# Altium schematic symbol library National Semiconductor Amplifier.SchLib: 1665 symbols (part 10 of 22) (continued)
## LMH6551MMX
designator U?
Differential, High Speed Op Amp, 8-pin Mini SOIC, 3500 Reel; PartNumber: LMH6551MMX; Manufacturer: National Semiconductor; PackageTopMarking: ZXTT*AU1A; PowerWise: Y; CompType: Amplifiers; DatasheetVersion: Feb-2005; PackageVersion: revF, Apr-2008; PackageReference: MUA08A; PackageDescription: MINI SOIC, .118 x .118 x .034in, 8 Lead, .0256in Pitch; RoHS: N; PinCount: 8; High-Reliability: Y; Code_JEDEC: MO-187-AA; ComponentLink1Description: Manufacturer URL; ComponentLink1URL: http://www.national.com/; ComponentLink2Description: LMH6551 Datasheet; ComponentLink2URL: http://www.national.com/ds/LM/LMH6551.pdf; ComponentLink3Description: LMH6551 Web Page; ComponentLink3URL: http://www.national.com/pf/LM/LMH6551.html; ComponentLink4Description: MUA08A Package Page; ComponentLink4URL: http://www.national.com/packaging/folders/mua08a.html
footprint MUA08A_N (TSOP, 8-Leads, Body 3x3mm, Pitch 0.65mm, IPC Medium Density)
footprint MUA08A_L (TSOP, 8-Leads, Body 3x3mm, Pitch 0.65mm, IPC High Density)
footprint MUA08A_M (TSOP, 8-Leads, Body 3x3mm, Pitch 0.65mm, IPC Low Density)
pins: 1 IN- (in), 2 VCM, 3 V+ (power), 4 OUT+ (out), 5 OUT- (out), 6 V- (power), 7 NC, 8 IN+ (in)

## LMH6551QMM/NOPB
designator U?
Differential, High Speed Op Amp, 8-pin Mini SOIC, Pb-Free, 1000 Reel; PartNumber: LMH6551QMM/NOPB; Manufacturer: National Semiconductor; PackageTopMarking: ZXTT*AU1Q; PowerWise: N; CompType: Amplifiers; High-Reliability: Y; DatasheetVersion: May-2011; PackageVersion: revF, Apr-2008; PackageReference: MUA08A; PackageDescription: MINI SOIC, .118 x .118 x .034in, 8 Lead, .0256in Pitch; RoHS: Y; PinCount: 8; Code_JEDEC: MO-187-AA; ComponentLink1Description: Manufacturer URL; ComponentLink1URL: http://www.national.com/; ComponentLink2Description: LMH6551 Datasheet; ComponentLink2URL: http://www.national.com/ds/LM/LMH6551.pdf; ComponentLink3Description: LMH6551 Web Page; ComponentLink3URL: http://www.national.com/pf/LM/LMH6551.html; ComponentLink4Description: MUA08A Package Page; ComponentLink4URL: http://www.national.com/packaging/folders/mua08a.html
footprint MUA08A_N (TSOP, 8-Leads, Body 3x3mm, Pitch 0.65mm, IPC Medium Density)
footprint MUA08A_L (TSOP, 8-Leads, Body 3x3mm, Pitch 0.65mm, IPC High Density)
footprint MUA08A_M (TSOP, 8-Leads, Body 3x3mm, Pitch 0.65mm, IPC Low Density)
pins: 1 IN- (in), 2 VCM, 3 V+ (power), 4 OUT+ (out), 5 OUT- (out), 6 V- (power), 7 NC, 8 IN+ (in)

## LMH6551QMME/NOPB
designator U?
Differential, High Speed Op Amp, 8-pin Mini SOIC, Pb-Free, 250 Reel; PartNumber: LMH6551QMME/NOPB; Manufacturer: National Semiconductor; PackageTopMarking: ZXTT*AU1Q; PowerWise: N; CompType: Amplifiers; High-Reliability: Y; DatasheetVersion: May-2011; PackageVersion: revF, Apr-2008; PackageReference: MUA08A; PackageDescription: MINI SOIC, .118 x .118 x .034in, 8 Lead, .0256in Pitch; RoHS: Y; PinCount: 8; Code_JEDEC: MO-187-AA; ComponentLink1Description: Manufacturer URL; ComponentLink1URL: http://www.national.com/; ComponentLink2Description: LMH6551 Datasheet; ComponentLink2URL: http://www.national.com/ds/LM/LMH6551.pdf; ComponentLink3Description: LMH6551 Web Page; ComponentLink3URL: http://www.national.com/pf/LM/LMH6551.html; ComponentLink4Description: MUA08A Package Page; ComponentLink4URL: http://www.national.com/packaging/folders/mua08a.html
footprint MUA08A_N (TSOP, 8-Leads, Body 3x3mm, Pitch 0.65mm, IPC Medium Density)
footprint MUA08A_L (TSOP, 8-Leads, Body 3x3mm, Pitch 0.65mm, IPC High Density)
footprint MUA08A_M (TSOP, 8-Leads, Body 3x3mm, Pitch 0.65mm, IPC Low Density)
pins: 1 IN- (in), 2 VCM, 3 V+ (power), 4 OUT+ (out), 5 OUT- (out), 6 V- (power), 7 NC, 8 IN+ (in)

## LMH6551QMMX/NOPB
designator U?
Differential, High Speed Op Amp, 8-pin Mini SOIC, Pb-Free, 3500 Reel; PartNumber: LMH6551QMMX/NOPB; Manufacturer: National Semiconductor; PackageTopMarking: ZXTT*AU1Q; PowerWise: N; CompType: Amplifiers; High-Reliability: Y; DatasheetVersion: May-2011; PackageVersion: revF, Apr-2008; PackageReference: MUA08A; PackageDescription: MINI SOIC, .118 x .118 x .034in, 8 Lead, .0256in Pitch; RoHS: Y; PinCount: 8; Code_JEDEC: MO-187-AA; ComponentLink1Description: Manufacturer URL; ComponentLink1URL: http://www.national.com/; ComponentLink2Description: LMH6551 Datasheet; ComponentLink2URL: http://www.national.com/ds/LM/LMH6551.pdf; ComponentLink3Description: LMH6551 Web Page; ComponentLink3URL: http://www.national.com/pf/LM/LMH6551.html; ComponentLink4Description: MUA08A Package Page; ComponentLink4URL: http://www.national.com/packaging/folders/mua08a.html
footprint MUA08A_N (TSOP, 8-Leads, Body 3x3mm, Pitch 0.65mm, IPC Medium Density)
footprint MUA08A_L (TSOP, 8-Leads, Body 3x3mm, Pitch 0.65mm, IPC High Density)
footprint MUA08A_M (TSOP, 8-Leads, Body 3x3mm, Pitch 0.65mm, IPC Low Density)
pins: 1 IN- (in), 2 VCM, 3 V+ (power), 4 OUT+ (out), 5 OUT- (out), 6 V- (power), 7 NC, 8 IN+ (in)

## LMH6552MA
designator U?
1.5 GHz Fully Differential Amplifier, 8-pin Narrow SOIC; PartNumber: LMH6552MA; Manufacturer: National Semiconductor; PackageTopMarking: NSZXTT*LMH65*52MA; PowerWise: Y; CompType: Amplifiers; DatasheetVersion: Sep-2007; PackageVersion: revM, May-2009; PackageReference: M08A; PackageDescription: SOIC Narrow, 4.9 x 3.9 x 1.45mm, 8 Lead, 1.27mm Pitch; RoHS: Y; PinCount: 8; High-Reliability: Y; Code_JEDEC: MS-012-AA; Code_IPC: SOIC127P600-8; ComponentLink1Description: Manufacturer URL; ComponentLink1URL: http://www.national.com/; ComponentLink2Description: LMH6552 Datasheet; ComponentLink2URL: http://www.national.com/ds/LM/LMH6552.pdf; ComponentLink3Description: LMH6552 Web Page; ComponentLink3URL: http://www.national.com/pf/LM/LMH6552.html; ComponentLink4Description: M08A Package Page; ComponentLink4URL: http://www.national.com/packaging/folders/m08a.html
footprint M08A_N (SOIC, 8-Leads, Body 4.9x3.9mm, Pitch 1.27mm, IPC Medium Density)
footprint M08A_L (SOIC, 8-Leads, Body 4.9x3.9mm, Pitch 1.27mm, IPC High Density)
footprint M08A_M (SOIC, 8-Leads, Body 4.9x3.9mm, Pitch 1.27mm, IPC Low Density)
pins: 1 IN- (in), 2 VCM, 3 V+ (power), 4 OUT+ (out), 5 OUT- (out), 6 V- (power), 7 EN, 8 IN+ (in)

## LMH6552MA/NOPB
designator U?
1.5 GHz Fully Differential Amplifier, 8-pin Narrow SOIC, Pb-Free; PartNumber: LMH6552MA/NOPB; Manufacturer: National Semiconductor; PackageTopMarking: NSZXTT*LMH65*52MA; PowerWise: Y; CompType: Amplifiers; DatasheetVersion: Sep-2007; PackageVersion: revM, May-2009; PackageReference: M08A; PackageDescription: SOIC Narrow, 4.9 x 3.9 x 1.45mm, 8 Lead, 1.27mm Pitch; RoHS: Y; PinCount: 8; High-Reliability: Y; Code_JEDEC: MS-012-AA; Code_IPC: SOIC127P600-8; ComponentLink1Description: Manufacturer URL; ComponentLink1URL: http://www.national.com/; ComponentLink2Description: LMH6552 Datasheet; ComponentLink2URL: http://www.national.com/ds/LM/LMH6552.pdf; ComponentLink3Description: LMH6552 Web Page; ComponentLink3URL: http://www.national.com/pf/LM/LMH6552.html; ComponentLink4Description: M08A Package Page; ComponentLink4URL: http://www.national.com/packaging/folders/m08a.html
footprint M08A_N (SOIC, 8-Leads, Body 4.9x3.9mm, Pitch 1.27mm, IPC Medium Density)
footprint M08A_L (SOIC, 8-Leads, Body 4.9x3.9mm, Pitch 1.27mm, IPC High Density)
footprint M08A_M (SOIC, 8-Leads, Body 4.9x3.9mm, Pitch 1.27mm, IPC Low Density)
pins: 1 IN- (in), 2 VCM, 3 V+ (power), 4 OUT+ (out), 5 OUT- (out), 6 V- (power), 7 EN, 8 IN+ (in)

## LMH6552MAX/NOPB
designator U?
1.5 GHz Fully Differential Amplifier, 8-pin Narrow SOIC, Pb-Free; PartNumber: LMH6552MAX/NOPB; Manufacturer: National Semiconductor; PackageTopMarking: NSZXTT*LMH65*52MA; PowerWise: Y; CompType: Amplifiers; DatasheetVersion: Sep-2007; PackageVersion: revM, May-2009; PackageReference: M08A; PackageDescription: SOIC Narrow, 4.9 x 3.9 x 1.45mm, 8 Lead, 1.27mm Pitch; RoHS: Y; PinCount: 8; High-Reliability: Y; Code_JEDEC: MS-012-AA; Code_IPC: SOIC127P600-8; ComponentLink1Description: Manufacturer URL; ComponentLink1URL: http://www.national.com/; ComponentLink2Description: LMH6552 Datasheet; ComponentLink2URL: http://www.national.com/ds/LM/LMH6552.pdf; ComponentLink3Description: LMH6552 Web Page; ComponentLink3URL: http://www.national.com/pf/LM/LMH6552.html; ComponentLink4Description: M08A Package Page; ComponentLink4URL: http://www.national.com/packaging/folders/m08a.html
footprint M08A_N (SOIC, 8-Leads, Body 4.9x3.9mm, Pitch 1.27mm, IPC Medium Density)
footprint M08A_L (SOIC, 8-Leads, Body 4.9x3.9mm, Pitch 1.27mm, IPC High Density)
footprint M08A_M (SOIC, 8-Leads, Body 4.9x3.9mm, Pitch 1.27mm, IPC Low Density)
pins: 1 IN- (in), 2 VCM, 3 V+ (power), 4 OUT+ (out), 5 OUT- (out), 6 V- (power), 7 EN, 8 IN+ (in)

## LMH6552SD
designator U?
1.5 GHz Fully Differential Amplifier, 8-pin LLP; PartNumber: LMH6552SD; Manufacturer: National Semiconductor; PackageTopMarking: XYTT*6552; PowerWise: Y; CompType: Amplifiers; DatasheetVersion: Sep-2007; PackageVersion: revA, Jan-2004; PackageReference: SDA08C; PackageDescription: LLP, Plastic, Dual, 2.5 x 3.0 x 0.8mm Body, 8 Lead, 0.5mm Pitch, No Pullback; RoHS: Y; PinCount: 8; High-Reliability: Y; ComponentLink1Description: Manufacturer URL; ComponentLink1URL: http://www.national.com/; ComponentLink2Description: LMH6552 Datasheet; ComponentLink2URL: http://www.national.com/ds/LM/LMH6552.pdf; ComponentLink3Description: LMH6552 Web Page; ComponentLink3URL: http://www.national.com/pf/LM/LMH6552.html; ComponentLink4Description: SDA08C Package Page; ComponentLink4URL: http://www.national.com/packaging/folders/sda08c.html
footprint SDA08C (SON, 8-Leads, Body 2.5x3mm, Pitch 0.5mm, NSC Recommended)
part A pins: 1 IN- (in), 2 VCM, 3 V+ (power), 4 OUT+ (out), 5 OUT- (out), 6 V- (power), 7 EN, 8 IN+ (in)
part B pins: 9 DAP

## LMH6552SD/NOPB
designator U?
1.5 GHz Fully Differential Amplifier, 8-pin LLP, Pb-Free; PartNumber: LMH6552SD/NOPB; Manufacturer: National Semiconductor; PackageTopMarking: XYTT*6552; PowerWise: Y; CompType: Amplifiers; DatasheetVersion: Sep-2007; PackageVersion: revA, Jan-2004; PackageReference: SDA08C; PackageDescription: LLP, Plastic, Dual, 2.5 x 3.0 x 0.8mm Body, 8 Lead, 0.5mm Pitch, No Pullback; RoHS: Y; PinCount: 8; High-Reliability: Y; ComponentLink1Description: Manufacturer URL; ComponentLink1URL: http://www.national.com/; ComponentLink2Description: LMH6552 Datasheet; ComponentLink2URL: http://www.national.com/ds/LM/LMH6552.pdf; ComponentLink3Description: LMH6552 Web Page; ComponentLink3URL: http://www.national.com/pf/LM/LMH6552.html; ComponentLink4Description: SDA08C Package Page; ComponentLink4URL: http://www.national.com/packaging/folders/sda08c.html
footprint SDA08C (SON, 8-Leads, Body 2.5x3mm, Pitch 0.5mm, NSC Recommended)
part A pins: 1 IN- (in), 2 VCM, 3 V+ (power), 4 OUT+ (out), 5 OUT- (out), 6 V- (power), 7 EN, 8 IN+ (in)
part B pins: 9 DAP

## LMH6552SDX/NOPB
designator U?
1.5 GHz Fully Differential Amplifier, 8-pin LLP, Pb-Free; PartNumber: LMH6552SDX/NOPB; Manufacturer: National Semiconductor; PackageTopMarking: XYTT*6552; PowerWise: Y; CompType: Amplifiers; DatasheetVersion: Sep-2007; PackageVersion: revA, Jan-2004; PackageReference: SDA08C; PackageDescription: LLP, Plastic, Dual, 2.5 x 3.0 x 0.8mm Body, 8 Lead, 0.5mm Pitch, No Pullback; RoHS: Y; PinCount: 8; High-Reliability: Y; ComponentLink1Description: Manufacturer URL; ComponentLink1URL: http://www.national.com/; ComponentLink2Description: LMH6552 Datasheet; ComponentLink2URL: http://www.national.com/ds/LM/LMH6552.pdf; ComponentLink3Description: LMH6552 Web Page; ComponentLink3URL: http://www.national.com/pf/LM/LMH6552.html; ComponentLink4Description: SDA08C Package Page; ComponentLink4URL: http://www.national.com/packaging/folders/sda08c.html
footprint SDA08C (SON, 8-Leads, Body 2.5x3mm, Pitch 0.5mm, NSC Recommended)
part A pins: 1 IN- (in), 2 VCM, 3 V+ (power), 4 OUT+ (out), 5 OUT- (out), 6 V- (power), 7 EN, 8 IN+ (in)
part B pins: 9 DAP

## LMH6553MR
designator U?
900 MHz Fully Differential Amplifier with Output Limiting Clamp, 9-pin PSOP; PartNumber: LMH6553; Manufacturer: National Semiconductor; PackageTopMarking: NSXYTT*LMH65*53MR; PowerWise: Y; CompType: Amplifiers; DatasheetVersion: Nov-2008; PackageVersion: revB, Dec-2007; PackageReference: MRA08B; PackageDescription: Molded, PSOP .193 x .154 x .058in, 8 Lead, .050in Pitch, Large DAP; RoHS: Y; PinCount: 8; High-Reliability: Y; Code_JEDEC: MS-012-AA; ComponentLink1Description: Manufacturer URL; ComponentLink1URL: http://www.national.com/; ComponentLink2Description: LMH6553 Datasheet; ComponentLink2URL: http://www.national.com/ds/LM/LMH6553.pdf; ComponentLink3Description: LMH6553 Web Page; ComponentLink3URL: http://www.national.com/pf/LM/LMH6553.html; ComponentLink4Description: MRA08B Package Page; ComponentLink4URL: http://www.national.com/packaging/folders/mra08b.html
footprint MRA08B_N (SOIC, 8-Leads, Body 4.9x3.9mm, Pitch 1.27mm, Thermal Pad, IPC Medium Density)
footprint MRA08B_L (SOIC, 8-Leads, Body 4.9x3.9mm, Pitch 1.27mm, Thermal Pad, IPC High Density)
footprint MRA08B_M (SOIC, 8-Leads, Body 4.9x3.9mm, Pitch 1.27mm, Thermal Pad, IPC Low Density)
part A pins: 1 IN- (in), 2 VCM, 3 V+ (power), 4 OUT+ (out), 5 OUT- (out), 6 V- (power), 7 VCLAMP, 8 IN+ (in)
part B pins: 9 DAP

## LMH6553MR/NOPB
designator U?
900 MHz Fully Differential Amplifier with Output Limiting Clamp, 8-pin PSOP, Pb-Free; PartNumber: LMH6553MR/NOPB; Manufacturer: National Semiconductor; PackageTopMarking: NSXYTT*LMH65*53MR; PowerWise: Y; CompType: Amplifiers; DatasheetVersion: Nov-2008; PackageVersion: revB, Dec-2007; PackageReference: MRA08B; PackageDescription: Molded, PSOP .193 x .154 x .058in, 8 Lead, .050in Pitch, Large DAP; RoHS: Y; PinCount: 8; High-Reliability: Y; Code_JEDEC: MS-012-AA; ComponentLink1Description: Manufacturer URL; ComponentLink1URL: http://www.national.com/; ComponentLink2Description: LMH6553 Datasheet; ComponentLink2URL: http://www.national.com/ds/LM/LMH6553.pdf; ComponentLink3Description: LMH6553 Web Page; ComponentLink3URL: http://www.national.com/pf/LM/LMH6553.html; ComponentLink4Description: MRA08B Package Page; ComponentLink4URL: http://www.national.com/packaging/folders/mra08b.html
footprint MRA08B_N (SOIC, 8-Leads, Body 4.9x3.9mm, Pitch 1.27mm, Thermal Pad, IPC Medium Density)
footprint MRA08B_L (SOIC, 8-Leads, Body 4.9x3.9mm, Pitch 1.27mm, Thermal Pad, IPC High Density)
footprint MRA08B_M (SOIC, 8-Leads, Body 4.9x3.9mm, Pitch 1.27mm, Thermal Pad, IPC Low Density)
part A pins: 1 IN- (in), 2 VCM, 3 V+ (power), 4 OUT+ (out), 5 OUT- (out), 6 V- (power), 7 VCLAMP, 8 IN+ (in)
part B pins: 9 DAP

## LMH6553MRE/NOPB
designator U?
900 MHz Fully Differential Amplifier with Output Limiting Clamp, 8-pin PSOP, Pb-Free; PartNumber: LMH6553MRE/NOPB; Manufacturer: National Semiconductor; PackageTopMarking: NSXYTT*LMH65*53MR; PowerWise: Y; CompType: Amplifiers; DatasheetVersion: Nov-2008; PackageVersion: revB, Dec-2007; PackageReference: MRA08B; PackageDescription: Molded, PSOP .193 x .154 x .058in, 8 Lead, .050in Pitch, Large DAP; RoHS: Y; PinCount: 8; High-Reliability: Y; Code_JEDEC: MS-012-AA; ComponentLink1Description: Manufacturer URL; ComponentLink1URL: http://www.national.com/; ComponentLink2Description: LMH6553 Datasheet; ComponentLink2URL: http://www.national.com/ds/LM/LMH6553.pdf; ComponentLink3Description: LMH6553 Web Page; ComponentLink3URL: http://www.national.com/pf/LM/LMH6553.html; ComponentLink4Description: MRA08B Package Page; ComponentLink4URL: http://www.national.com/packaging/folders/mra08b.html
footprint MRA08B_N (SOIC, 8-Leads, Body 4.9x3.9mm, Pitch 1.27mm, Thermal Pad, IPC Medium Density)
footprint MRA08B_L (SOIC, 8-Leads, Body 4.9x3.9mm, Pitch 1.27mm, Thermal Pad, IPC High Density)
footprint MRA08B_M (SOIC, 8-Leads, Body 4.9x3.9mm, Pitch 1.27mm, Thermal Pad, IPC Low Density)
part A pins: 1 IN- (in), 2 VCM, 3 V+ (power), 4 OUT+ (out), 5 OUT- (out), 6 V- (power), 7 VCLAMP, 8 IN+ (in)
part B pins: 9 DAP

## LMH6553MRX/NOPB
designator U?
900 MHz Fully Differential Amplifier with Output Limiting Clamp, 8-pin PSOP, Pb-Free; PartNumber: LMH6553MRX/NOPB; Manufacturer: National Semiconductor; PackageTopMarking: NSXYTT*LMH65*53MR; PowerWise: Y; CompType: Amplifiers; DatasheetVersion: Nov-2008; PackageVersion: revB, Dec-2007; PackageReference: MRA08B; PackageDescription: Molded, PSOP .193 x .154 x .058in, 8 Lead, .050in Pitch, Large DAP; RoHS: Y; PinCount: 8; High-Reliability: Y; Code_JEDEC: MS-012-AA; ComponentLink1Description: Manufacturer URL; ComponentLink1URL: http://www.national.com/; ComponentLink2Description: LMH6553 Datasheet; ComponentLink2URL: http://www.national.com/ds/LM/LMH6553.pdf; ComponentLink3Description: LMH6553 Web Page; ComponentLink3URL: http://www.national.com/pf/LM/LMH6553.html; ComponentLink4Description: MRA08B Package Page; ComponentLink4URL: http://www.national.com/packaging/folders/mra08b.html
footprint MRA08B_N (SOIC, 8-Leads, Body 4.9x3.9mm, Pitch 1.27mm, Thermal Pad, IPC Medium Density)
footprint MRA08B_L (SOIC, 8-Leads, Body 4.9x3.9mm, Pitch 1.27mm, Thermal Pad, IPC High Density)
footprint MRA08B_M (SOIC, 8-Leads, Body 4.9x3.9mm, Pitch 1.27mm, Thermal Pad, IPC Low Density)
part A pins: 1 IN- (in), 2 VCM, 3 V+ (power), 4 OUT+ (out), 5 OUT- (out), 6 V- (power), 7 VCLAMP, 8 IN+ (in)
part B pins: 9 DAP

## LMH6553SD
designator U?
900 MHz Fully Differential Amplifier with Output Limiting Clamp, 8-pin LLP; PartNumber: LMH6553; Manufacturer: National Semiconductor; PackageTopMarking: XYTT*6553; PowerWise: Y; CompType: Amplifiers; DatasheetVersion: Nov-2008; PackageVersion: revA, Jan-2004; PackageReference: SDA08C; PackageDescription: LLP, Plastic, Dual, 2.5 x 3.0 x 0.8mm Body, 8 Lead, 0.5mm Pitch, No Pullback; RoHS: Y; PinCount: 8; High-Reliability: Y; ComponentLink1Description: Manufacturer URL; ComponentLink1URL: http://www.national.com/; ComponentLink2Description: LMH6553 Datasheet; ComponentLink2URL: http://www.national.com/ds/LM/LMH6553.pdf; ComponentLink3Description: LMH6553 Web Page; ComponentLink3URL: http://www.national.com/pf/LM/LMH6553.html; ComponentLink4Description: SDA08C Package Page; ComponentLink4URL: http://www.national.com/packaging/folders/sda08c.html
footprint SDA08C (SON, 8-Leads, Body 2.5x3mm, Pitch 0.5mm, NSC Recommended)
part A pins: 1 IN- (in), 2 VCM, 3 V+ (power), 4 OUT+ (out), 5 OUT- (out), 6 V- (power), 7 VCLAMP, 8 IN+ (in)
part B pins: 9 DAP

## LMH6553SD/NOPB
designator U?
900 MHz Fully Differential Amplifier with Output Limiting Clamp, 8-pin LLP, Pb-Free; PartNumber: LMH6553SD/NOPB; Manufacturer: National Semiconductor; PackageTopMarking: XYTT*6553; PowerWise: Y; CompType: Amplifiers; DatasheetVersion: Nov-2008; PackageVersion: revA, Jan-2004; PackageReference: SDA08C; PackageDescription: LLP, Plastic, Dual, 2.5 x 3.0 x 0.8mm Body, 8 Lead, 0.5mm Pitch, No Pullback; RoHS: Y; PinCount: 8; High-Reliability: Y; ComponentLink1Description: Manufacturer URL; ComponentLink1URL: http://www.national.com/; ComponentLink2Description: LMH6553 Datasheet; ComponentLink2URL: http://www.national.com/ds/LM/LMH6553.pdf; ComponentLink3Description: LMH6553 Web Page; ComponentLink3URL: http://www.national.com/pf/LM/LMH6553.html; ComponentLink4Description: SDA08C Package Page; ComponentLink4URL: http://www.national.com/packaging/folders/sda08c.html
footprint SDA08C (SON, 8-Leads, Body 2.5x3mm, Pitch 0.5mm, NSC Recommended)
part A pins: 1 IN- (in), 2 VCM, 3 V+ (power), 4 OUT+ (out), 5 OUT- (out), 6 V- (power), 7 VCLAMP, 8 IN+ (in)
part B pins: 9 DAP

## LMH6553SDE/NOPB
designator U?
900 MHz Fully Differential Amplifier with Output Limiting Clamp, 8-pin LLP, Pb-Free; PartNumber: LMH6553SDE/NOPB; Manufacturer: National Semiconductor; PackageTopMarking: XYTT*6553; PowerWise: Y; CompType: Amplifiers; DatasheetVersion: Nov-2008; PackageVersion: revA, Jan-2004; PackageReference: SDA08C; PackageDescription: LLP, Plastic, Dual, 2.5 x 3.0 x 0.8mm Body, 8 Lead, 0.5mm Pitch, No Pullback; RoHS: Y; PinCount: 8; High-Reliability: Y; ComponentLink1Description: Manufacturer URL; ComponentLink1URL: http://www.national.com/; ComponentLink2Description: LMH6553 Datasheet; ComponentLink2URL: http://www.national.com/ds/LM/LMH6553.pdf; ComponentLink3Description: LMH6553 Web Page; ComponentLink3URL: http://www.national.com/pf/LM/LMH6553.html; ComponentLink4Description: SDA08C Package Page; ComponentLink4URL: http://www.national.com/packaging/folders/sda08c.html
footprint SDA08C (SON, 8-Leads, Body 2.5x3mm, Pitch 0.5mm, NSC Recommended)
part A pins: 1 IN- (in), 2 VCM, 3 V+ (power), 4 OUT+ (out), 5 OUT- (out), 6 V- (power), 7 VCLAMP, 8 IN+ (in)
part B pins: 9 DAP

## LMH6553SDX/NOPB
designator U?
900 MHz Fully Differential Amplifier with Output Limiting Clamp, 8-pin LLP, Pb-Free; PartNumber: LMH6553SDX/NOPB; Manufacturer: National Semiconductor; PackageTopMarking: XYTT*6553; PowerWise: Y; CompType: Amplifiers; DatasheetVersion: Nov-2008; PackageVersion: revA, Jan-2004; PackageReference: SDA08C; PackageDescription: LLP, Plastic, Dual, 2.5 x 3.0 x 0.8mm Body, 8 Lead, 0.5mm Pitch, No Pullback; RoHS: Y; PinCount: 8; High-Reliability: Y; ComponentLink1Description: Manufacturer URL; ComponentLink1URL: http://www.national.com/; ComponentLink2Description: LMH6553 Datasheet; ComponentLink2URL: http://www.national.com/ds/LM/LMH6553.pdf; ComponentLink3Description: LMH6553 Web Page; ComponentLink3URL: http://www.national.com/pf/LM/LMH6553.html; ComponentLink4Description: SDA08C Package Page; ComponentLink4URL: http://www.national.com/packaging/folders/sda08c.html
footprint SDA08C (SON, 8-Leads, Body 2.5x3mm, Pitch 0.5mm, NSC Recommended)
part A pins: 1 IN- (in), 2 VCM, 3 V+ (power), 4 OUT+ (out), 5 OUT- (out), 6 V- (power), 7 VCLAMP, 8 IN+ (in)
part B pins: 9 DAP

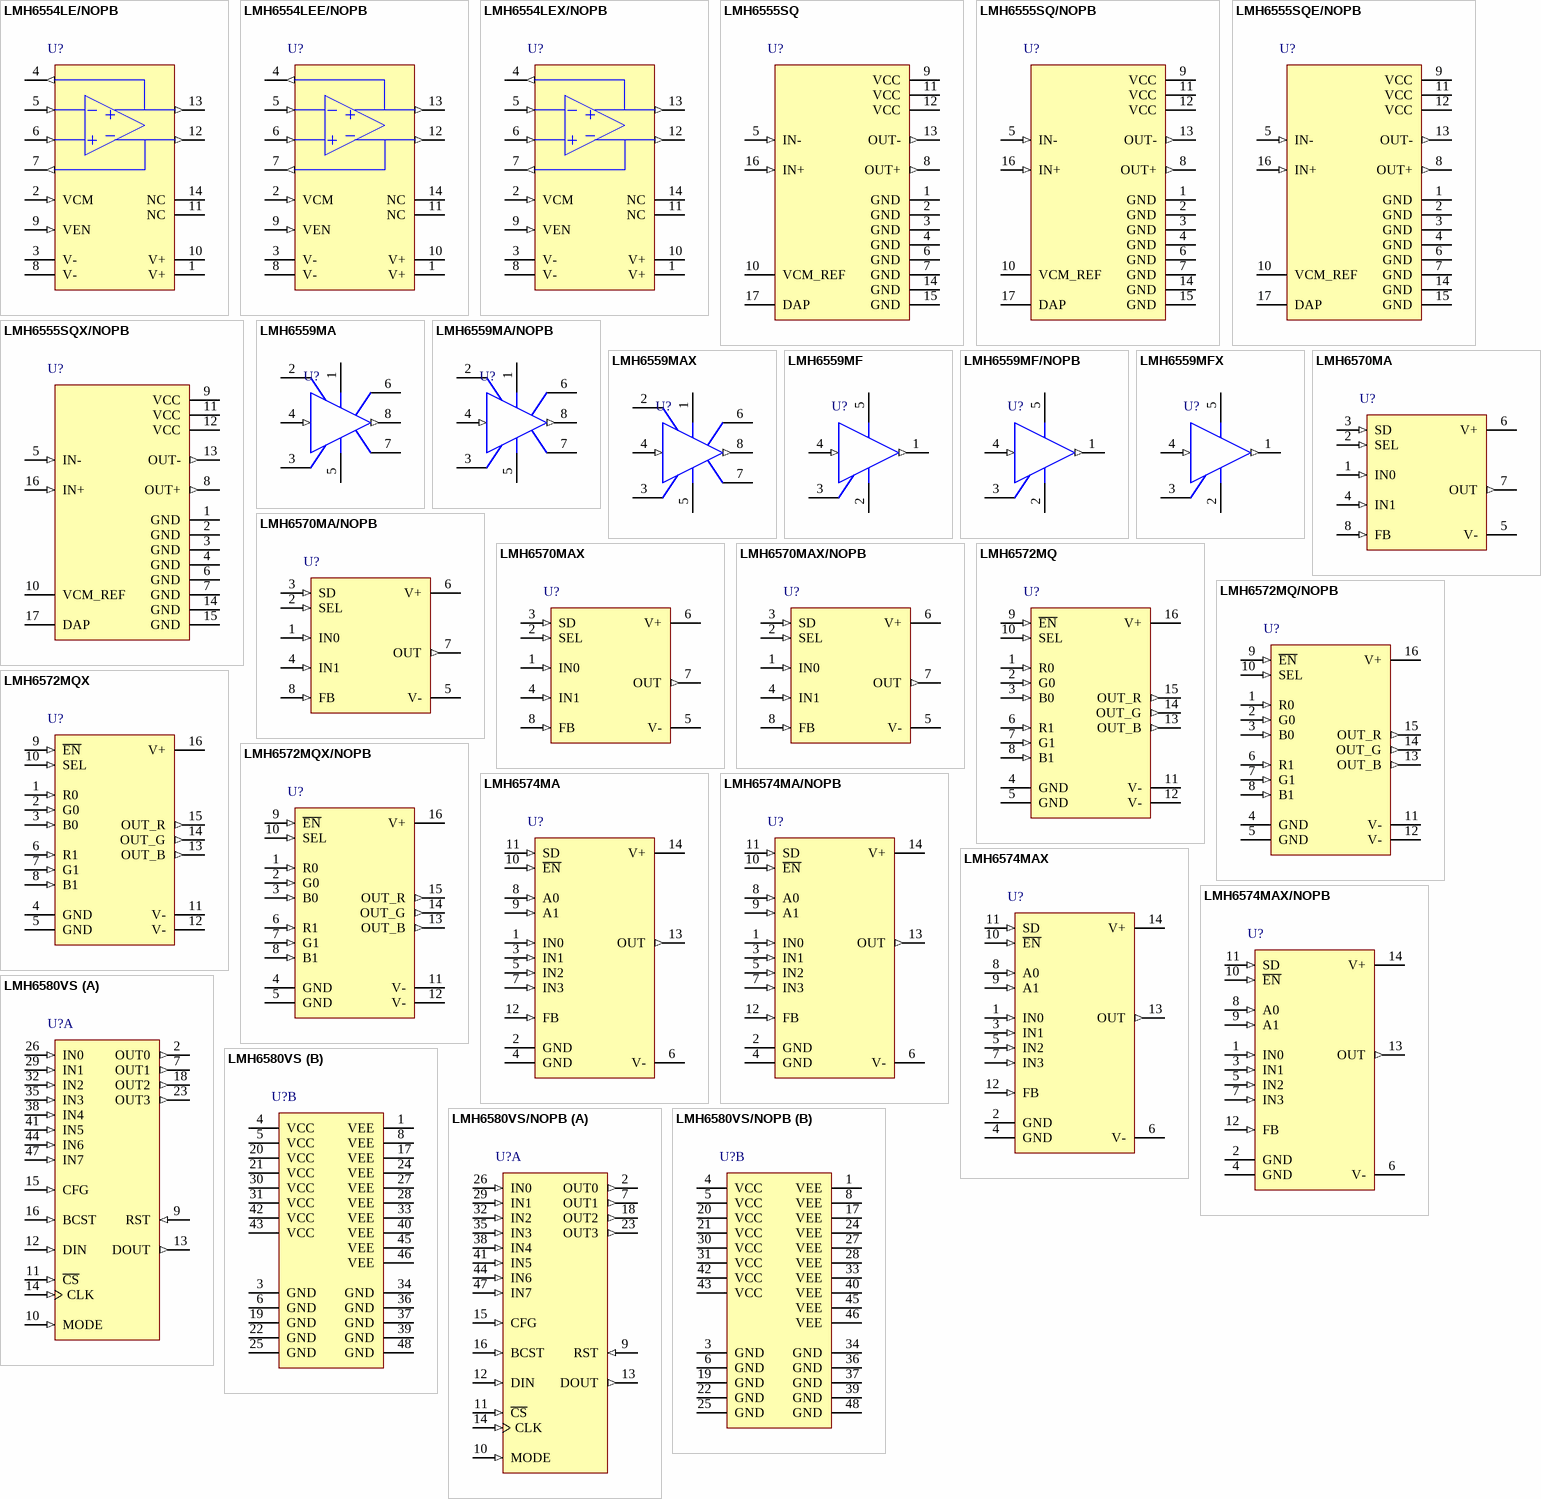
[diagram p42: symbols LMH6554LE/NOPB to LMH6580VS/NOPB]

## LMH6554LE/NOPB
designator U?
2.8 GHz Ultra Linear Fully Differential Amplifier, 14-pin LLP, Pb-Free; PartNumber: LMH6554LE/NOPB; Manufacturer: National Semiconductor; PackageTopMarking: XYTT*AJA; PowerWise: Y; CompType: Amplifiers; DatasheetVersion: Oct-2009; PackageVersion: revB, Apr-2008; PackageReference: LEE14A; PackageDescription: LLP, Plastic, Quad, 2.5 x 2.5 x 0.6mm Body, 14 Lead, 0.4mm Pitch, No Pullback; RoHS: Y; PinCount: 14; High-Reliability: Y; ComponentLink1Description: Manufacturer URL; ComponentLink1URL: http://www.national.com/; ComponentLink2Description: LMH6554 Datasheet; ComponentLink2URL: http://www.national.com/ds/LM/LMH6554.pdf; ComponentLink3Description: LMH6554 Web Page; ComponentLink3URL: http://www.national.com/pf/LM/LMH6554.html; ComponentLink4Description: LEE14A Package Page; ComponentLink4URL: http://www.national.com/packaging/folders/lee14a.html
footprint LEE14A (QFN, 14-Leads, Body 2.5x2.5 mm, Pitch 0.4mm, NSC Recommended)
pins: 1 V+ (power), 2 VCM (in), 3 V- (power), 4 +FB (out), 5 -IN (in), 6 +IN (in), 7 -FB (out), 8 V- (power), 9 VEN (in), 10 V+ (power), 11 NC, 12 -OUT (out), 13 +OUT (out), 14 NC

## LMH6554LEE/NOPB
designator U?
2.8 GHz Ultra Linear Fully Differential Amplifier, 14-pin LLP, Pb-Free; PartNumber: LMH6554LEE/NOPB; Manufacturer: National Semiconductor; PackageTopMarking: XYTT*AJA; PowerWise: Y; CompType: Amplifiers; DatasheetVersion: Oct-2009; PackageVersion: revB, Apr-2008; PackageReference: LEE14A; PackageDescription: LLP, Plastic, Quad, 2.5 x 2.5 x 0.6mm Body, 14 Lead, 0.4mm Pitch, No Pullback; RoHS: Y; PinCount: 14; High-Reliability: Y; ComponentLink1Description: Manufacturer URL; ComponentLink1URL: http://www.national.com/; ComponentLink2Description: LMH6554 Datasheet; ComponentLink2URL: http://www.national.com/ds/LM/LMH6554.pdf; ComponentLink3Description: LMH6554 Web Page; ComponentLink3URL: http://www.national.com/pf/LM/LMH6554.html; ComponentLink4Description: LEE14A Package Page; ComponentLink4URL: http://www.national.com/packaging/folders/lee14a.html
footprint LEE14A (QFN, 14-Leads, Body 2.5x2.5 mm, Pitch 0.4mm, NSC Recommended)
pins: 1 V+ (power), 2 VCM (in), 3 V- (power), 4 +FB (out), 5 -IN (in), 6 +IN (in), 7 -FB (out), 8 V- (power), 9 VEN (in), 10 V+ (power), 11 NC, 12 -OUT (out), 13 +OUT (out), 14 NC

## LMH6554LEX/NOPB
designator U?
2.8 GHz Ultra Linear Fully Differential Amplifier, 14-pin LLP, Pb-Free; PartNumber: LMH6554LEX/NOPB; Manufacturer: National Semiconductor; PackageTopMarking: XYTT*AJA; PowerWise: Y; CompType: Amplifiers; DatasheetVersion: Oct-2009; PackageVersion: revB, Apr-2008; PackageReference: LEE14A; PackageDescription: LLP, Plastic, Quad, 2.5 x 2.5 x 0.6mm Body, 14 Lead, 0.4mm Pitch, No Pullback; RoHS: Y; PinCount: 14; High-Reliability: Y; ComponentLink1Description: Manufacturer URL; ComponentLink1URL: http://www.national.com/; ComponentLink2Description: LMH6554 Datasheet; ComponentLink2URL: http://www.national.com/ds/LM/LMH6554.pdf; ComponentLink3Description: LMH6554 Web Page; ComponentLink3URL: http://www.national.com/pf/LM/LMH6554.html; ComponentLink4Description: LEE14A Package Page; ComponentLink4URL: http://www.national.com/packaging/folders/lee14a.html
footprint LEE14A (QFN, 14-Leads, Body 2.5x2.5 mm, Pitch 0.4mm, NSC Recommended)
pins: 1 V+ (power), 2 VCM (in), 3 V- (power), 4 +FB (out), 5 -IN (in), 6 +IN (in), 7 -FB (out), 8 V- (power), 9 VEN (in), 10 V+ (power), 11 NC, 12 -OUT (out), 13 +OUT (out), 14 NC
